# Altium footprint library ATROTECH.PcbLib: 334 footprints (part 13 of 21)
Each footprint in its own frame and in the unit in brackets; x right, y up, seen from the top. Pads: shape width x height; smd on the part's side, far side on the other; paste and mask are expansions set on the pad; w line width, h text height; cw(c..) or ccw(c..) is an arc to the next point about the centre after c.
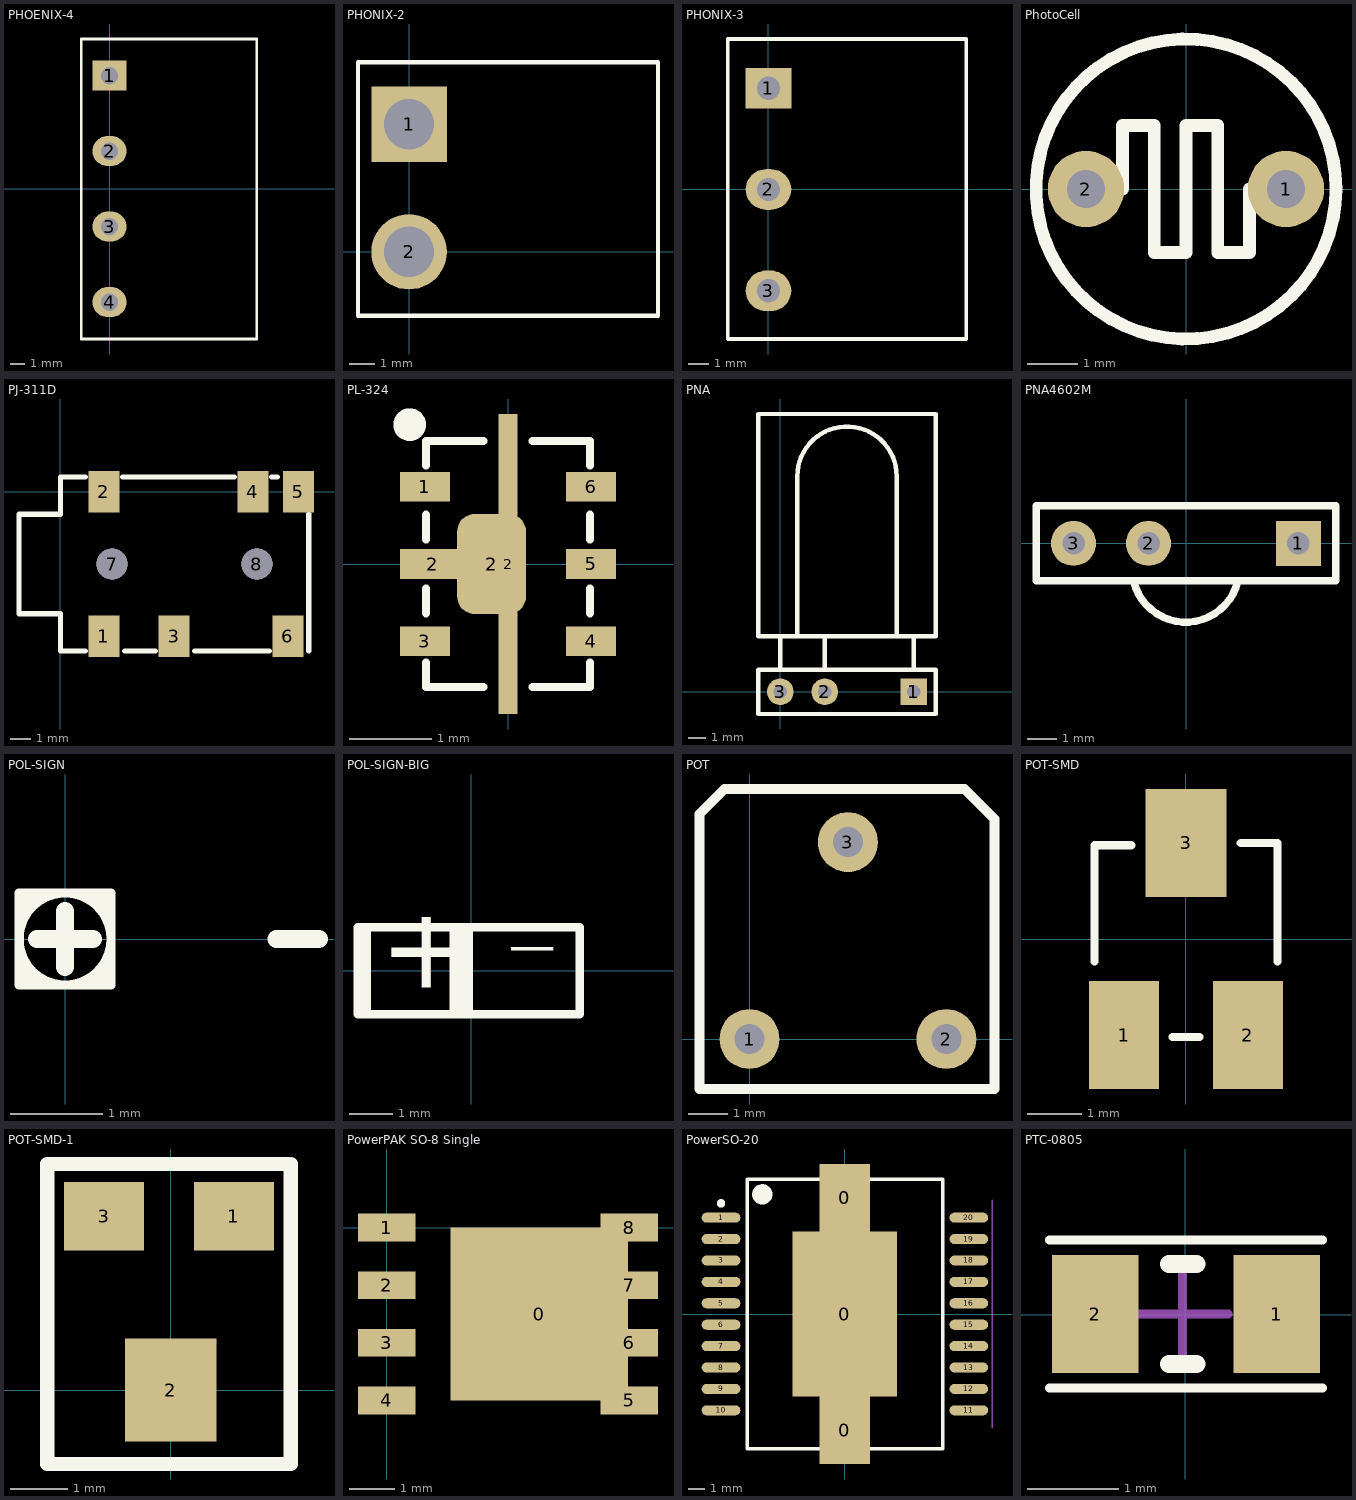
[diagram p12: the footprints below, top view; thin cyan lines are the x and y axes]

## PHOENIX-4 [mil]
pads (4):
  rect 90x80 hole 46: 1(0,300)
  oval 90x80 hole 46: 2(0,100) 3(0,-100) 4(0,-300)
Top Overlay:
  lines w7: -74.8,-397.64 -74.8,397 390,397 390,-397.64 -74.8,-397.64
3D body "User Library-Connector 4 Pins.step": height 669.29, standoff -110.03, extent -70.87,-393.08 796.58,393.08

## PHONIX-2 [mm]
pads (2):
  rect 3x3 hole 2: 1(0,5.08)
  round 3 hole 2: 2(0,0)
Top Overlay:
  lines w0.178: -2.032,7.544 -2.032,-2.54 9.906,-2.54 9.906,7.544 -1.983,7.544
3D body "MSTB 2,5_2_ST_1754449 + MSTB 2,5_ 2_G_1754436 (Phoenix Contact).STEP": height 15.3, standoff -3.34, extent -2.1,-2.5 19.9,7.5

## PHONIX-3 [mil]
pads (3):
  rect 90x80 hole 46: 1(0,200)
  oval 90x80 hole 46: 2(0,0) 3(0,-200)
Top Overlay:
  lines w7: -80,297 -80,-295.05 390,-295.05 390,297 -78.07,297
3D body "MSTB 2,5_3_ST_1754465 + MSTB 2,5_ 3_G_1754452 (Phoenix Contact).STEP": height 606.53, standoff -127.33, extent -78.07,-295.55 788.07,295

## PhotoCell [mil] "PhotoCell"
height 118.11
pads (2):
  round 60 hole 30: 1(78.74,0) 2(-78.74,0)
Top Overlay:
  circle w10: c0,0 r118.11
  lines w10: -50,0 -50,50 -25,50 -25,-50 0,-50 0,50 25,50 25,-50 50,-50 50,0

## PJ-311D [mm]
pads (8):
  rect 1.5x2 smd: 1(2.1,-7) 2(2.1,0) 3(5.5,-7) 4(9.3,0) 5(11.5,0) 6(11,-7)
  round 1.5 hole 1.5: 7(2.5,-3.5) 8(9.5,-3.5)
Top Overlay:
  lines w0.254: 1.2,-7.7 0,-7.7 0,-5.9 -2,-5.9 -2,-3.5 -2,-1.1 0,-1.1 0,0.7 1.2,0.7 ; 3,0.7 8.4,0.7 ; 3.1,-7.7 4.6,-7.7 ; 6.5,-7.7 10.1,-7.7 ; 10.2,0.7 10.5,0.7 ; 12,-7.7 12,-1.1
3D body "sj2-35894d-smt-tr.stp": height 4.92, standoff -0.48, extent -2,-7.65 12,0.65

## PL-324 [mm]
pads (8):
  rect 0.61x0.36 smd: 1(-1.015,0.94) 3(-1.015,-0.94) 4(1.015,-0.94) 5(1.015,0) 6(1.015,0.94)
  rect 0.8x0.36 smd: 2(-0.92,0)
  rrect50% 0.84x1.22 smd: 2(-0.2,0)
  rect 0.23x3.66 smd: 2(0,0)
Top Overlay:
  circle w0.2: c-1.2,1.7 r0.1
  lines w0.1: -1,-1.2 -1,-1.5 -0.3,-1.5 ; -1,-0.6 -1,-0.3 ; -1,0.3 -1,0.6 ; -1,1.2 -1,1.5 -0.3,1.5 ; 0.3,-1.5 1,-1.5 1,-1.2 ; 0.3,1.5 1,1.5 1,1.2 ; 1,-0.6 1,-0.3 ; 1,0.3 1,0.6

## PNA [mil] "IR RECIVER"
pads (3):
  rect 60x60 hole 30: 1(300,0)
  round 60 hole 30: 2(100,0) 3(0,0)
Top Overlay:
  lines w10: 0,50 0,125 ; 38.2,125 38.2,485 cw(c150,485) 261.8,485 261.8,125 ; 100,50 100,125 ; 300,50 300,120 ; -50,-50 -50,50 350,50 350,-50 -50,-50 ; -50,125 -50,625 350,625 350,125 -50,125

## PNA4602M [mil] "38KHz IR Reciver Module"
pads (3):
  rect 60x60 hole 30: 1(150,0)
  round 60 hole 30: 2(-50,0) 3(-150,0)
Top Overlay:
  lines w10: -70,-50 ccw(c-0.36,-33.41) 69.28,-50 ; -200,-50 -200,50 200,50 200,-50 -200,-50

## POL-SIGN [mm]
Top Overlay:
  circle w0.1: c0,0 r0.5
  region: -0.5,0.5 -0.2,0.5 -0.5,0.2
  region: 0.5,0.5 0.5,0.2 0.2,0.5
  region: 0.5,-0.5 0.2,-0.5 0.5,-0.2
  region: -0.5,-0.5 -0.5,-0.2 -0.2,-0.5
  lines w0.1: -0.5,-0.5 -0.5,0.5 0.5,0.5 0.5,-0.5 -0.5,-0.5
  lines w0.2: -0.3,0 0.3,0 ; 0,-0.3 0,0.3 ; 2.3,0 2.76,0

## POL-SIGN-BIG [mm]
Top Overlay:
  lines w0.2: -2.4,-1 -2.4,1 ; -0.4,-1 -0.4,1 -0.2,1 -0.2,-1 -0.05,-1 -0.05,1 0,1 ; -2.6,-1 -2.6,1 2.5,1 2.5,-1 -2.6,-1
  text "-" at 1.1,-0.74 h3.2
  text "-" at 0.8,-0.74 h3.2
  text "+" at -2.1,-1 h3.2

## POT [mil]
pads (3):
  round 60 hole 30: 1(0,0) 2(196.85,0) 3(98.43,196.85)
Top Overlay:
  lines w10: -50,-50 245,-50 245,220 215,250 -25,250 -50,225 -50,-50
3D body "Pot - RES_VAR1.STEP": height 295.28, standoff -133.86, extent -27.95,-54.68 227.95,222.87

## POT-SMD [mm]
pads (3):
  rect 1.3x2 smd: 1(-1.15,-1.784) 2(1.15,-1.784)
  rect 1.5x2 smd: 3(0,1.784)
Top Overlay:
  lines w0.15: -1.7,-0.419 -1.7,1.74 -1.016,1.74 ; -0.254,-1.816 0.254,-1.816 ; 1.016,1.784 1.7,1.784 1.7,-0.419
3D body "TRIMMER_PVG3A.STEP": height 2, standoff 0, extent -1.7,-1.816 1.7,1.784

## POT-SMD-1 [mm]
pads (3):
  rect 1.4x1.2 smd: 1(1.105,3.046) 3(-1.172,3.046)
  rect 1.6x1.8 smd: 2(0,0)
Top Overlay:
  lines w0.254: -2.167,-1.296 2.1,-1.296 2.1,3.962 -2.167,3.962 -2.167,-1.296

## PowerPAK SO-8 Single [mm]
pads (9):
  rect 3.91x3.81 smd: 0(3.36,-1.905)
  rect 1.27x0.61 smd: 1(0,0) 2(0,-1.27) 3(0,-2.54) 4(0,-3.81) 5(5.34,-3.81) 6(5.34,-2.54) 7(5.34,-1.27) 8(5.34,0)
3D body "User Library-PowerPAK SO-8 (S).step": height 1.04, standoff 0, extent -0.375,-4.5 5.775,0.65

## PowerSO-20 [mm]
pads (23):
  rect 3x4 smd: 0(0,-6.9) 0(0,6.9)
  rect 6.2x9.8 smd: 0(0,0)
  oval 2.3x0.6 smd: 1(-7.35,5.715) 2(-7.35,4.445) 3(-7.35,3.175) 4(-7.35,1.905) 5(-7.35,0.635) 6(-7.35,-0.635) 7(-7.35,-1.905) 8(-7.35,-3.175) 9(-7.35,-4.445) 10(-7.35,-5.715) 11(7.35,-5.715) 12(7.35,-4.445) 13(7.35,-3.175) 14(7.35,-1.905) 15(7.35,-0.635) 16(7.35,0.635) 17(7.35,1.905) 18(7.35,3.175) 19(7.35,4.445) 20(7.35,5.715)
Top Overlay:
  circle w0.6: c-4.9,7.1 r0.3
  circle w0.25: c-7.35,6.565 r0.125
  lines w0.2: -5.8,-8 5.8,-8 5.8,8 -5.8,8 -5.8,-8
Mechanical 15:
  lines w0.1: 8.75,-6.75 8.75,6.75
3D body "User Library-PowerSO20.STEP": height 3.6, standoff 0, extent -7.2,-8 7.2,8

## PTC-0805 [mm]
pads (2):
  rect 0.95x1.3 smd: 1(1.008,0.009) 2(-0.992,0.009)
Top Overlay:
  lines w0.1: -1.492,-0.804 1.508,-0.804 ; -1.492,0.822 1.508,0.822
  lines w0.2: -0.18,-0.541 0.12,-0.541 ; -0.18,0.559 0.12,0.559
Mechanical 15:
  lines w0.1: -0.53,0.009 0.47,0.009 ; -0.03,-0.491 -0.03,0.509
3D body "Part2.SLDPRT": height 0.66, standoff 0, extent -1.075,-0.675 1.075,0.675